# Altium footprint library Hare_Library.PcbLib: 252 footprints (part 6 of 16)
Each footprint in its own frame and in the unit in brackets; x right, y up, seen from the top. Pads: shape width x height; smd on the part's side, far side on the other; paste and mask are expansions set on the pad; w line width, h text height; cw(c..) or ccw(c..) is an arc to the next point about the centre after c.
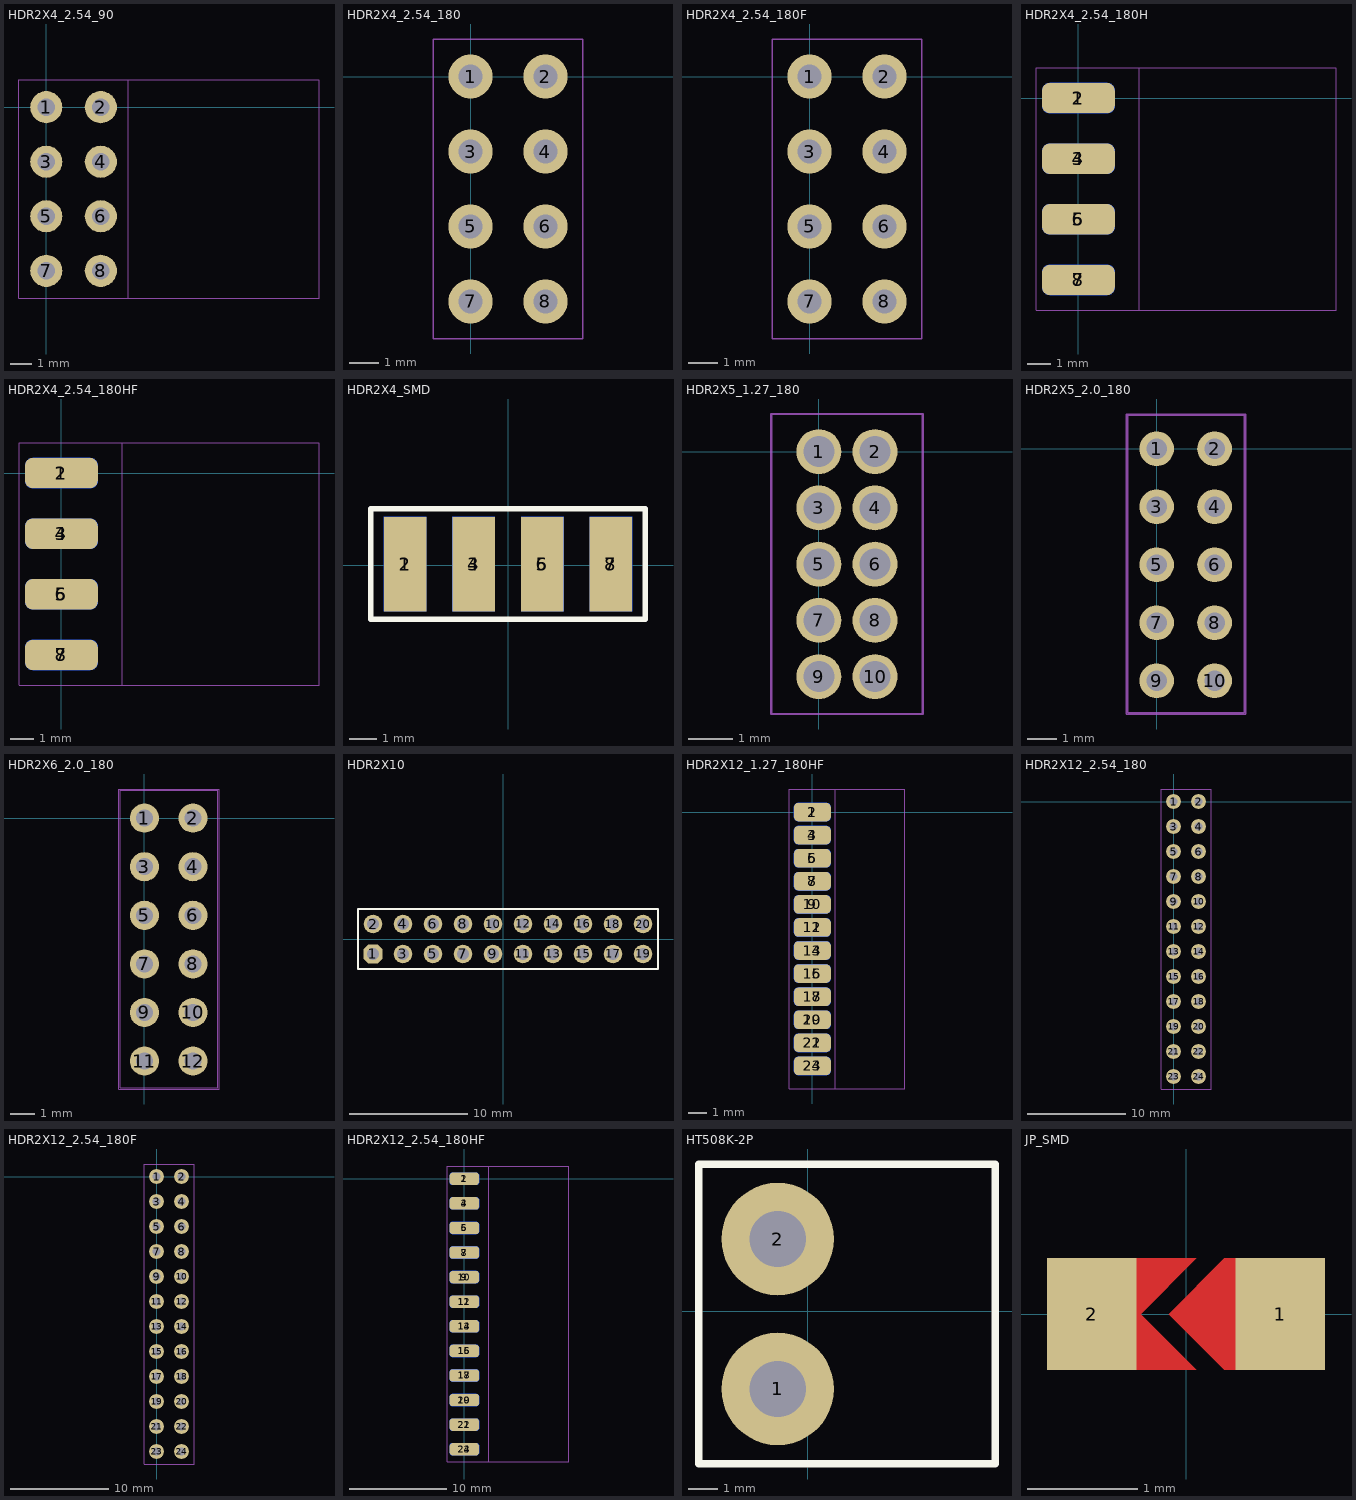
[diagram p5: the footprints below, top view; thin cyan lines are the x and y axes]

## HDR2X4_2.54_90 [mm]
height 4.3
pads (8):
  round 1.5 hole 0.813: 1(0,0) 2(2.54,0) 3(0,-2.54) 4(2.54,-2.54) 5(0,-5.08) 6(2.54,-5.08) 7(0,-7.62) 8(2.54,-7.62)
Mechanical 13:
  lines w0.051: -1.27,-8.89 12.7,-8.89 12.7,1.27 -1.27,1.27 -1.27,-8.89
Mechanical 14:
  lines w0.051: -1.27,-8.89 3.81,-8.89 3.81,1.27 -1.27,1.27 -1.27,-8.89
3D body "pin_header_awl254-da-g08d.stp": height 5.04, standoff -2.96, extent -0.316,-8.89 12.564,1.27

## HDR2X4_2.54_180 [mm]
height 4.3
pads (8):
  round 1.5 hole 0.813: 1(0,0) 2(2.54,0) 3(0,-2.54) 4(2.54,-2.54) 5(0,-5.08) 6(2.54,-5.08) 7(0,-7.62) 8(2.54,-7.62)
Mechanical 13:
  lines w0.051: -1.27,-8.89 -1.27,1.27 3.81,1.27 3.81,-8.89 -1.27,-8.89
Mechanical 14:
  lines w0.051: -1.27,-8.89 -1.27,1.27 3.81,1.27 3.81,-8.89 -1.27,-8.89
3D body "pin_header_awl254-dg-g08d.stp": height 8.5, standoff -3, extent -1.27,-8.89 3.81,1.27

## HDR2X4_2.54_180F [mm]
height 4.3
pads (8):
  round 1.5 hole 0.813: 1(0,0) 2(2.54,0) 3(0,-2.54) 4(2.54,-2.54) 5(0,-5.08) 6(2.54,-5.08) 7(0,-7.62) 8(2.54,-7.62)
Mechanical 13:
  lines w0.051: -1.27,-8.89 -1.27,1.27 3.81,1.27 3.81,-8.89 -1.27,-8.89
Mechanical 14:
  lines w0.051: -1.27,-8.89 -1.27,1.27 3.81,1.27 3.81,-8.89 -1.27,-8.89
3D body "female_header_a-bl254-dg-g08d.stp": height 8.5, standoff -3.2, extent -1.23,-9.015 3.77,1.395

## HDR2X4_2.54_180H [mil]
height 169.29
pads (8):
  rrect50% 120x50 smd: 1(0,0) 3(0,-100) 5(0,-200) 7(0,-300)
  rrect50% 120x50 smd far side: 2(0,0) 4(0,-100) 6(0,-200) 8(0,-300)
Mechanical 13:
  lines w2: -70,-350 425,-350 425,50 -70,50 -70,-350
Mechanical 14:
  lines w2: -70,-350 100,-350 100,50 -70,50 -70,-350
Mechanical 15:
  lines w2: -70,-350 100,-350 100,50 -70,50 -70,-350
3D body "pin_header_awl254-dg-g08d.stp": height 78, standoff -122, extent -38.11,-350 414.64,50

## HDR2X4_2.54_180HF [mil]
height 169.29
pads (8):
  rrect50% 120x50 smd: 1(0,0) 3(0,-100) 5(0,-200) 7(0,-300)
  rrect50% 120x50 smd far side: 2(0,0) 4(0,-100) 6(0,-200) 8(0,-300)
Mechanical 13:
  lines w2: -70,-350 -70,50 425,50 425,-350 -70,-350
Mechanical 14:
  lines w2: -70,-350 -70,50 100,50 100,-350 -70,-350
Mechanical 15:
  lines w2: -70,-350 -70,50 100,50 100,-350 -70,-350
3D body "female_header_a-bl254-dg-g08d.stp": height 76.43, standoff -120.43, extent -35.98,-354.92 424.65,54.92

## HDR2X4_SMD [mm]
pads (8):
  rect 1.575x3.5 smd: 1(-3.819,0.047) 3(-1.279,0.047) 5(1.261,0.047) 7(3.801,0.047)
  rect 1.575x3.5 smd far side: 2(-3.819,0.047) 4(-1.279,0.047) 6(1.261,0.047) 8(3.801,0.047)
Top Overlay:
  lines w0.203: -5.089,-2 5.071,-2 5.071,2.1 -5.089,2.1 -5.089,-2
3D body "User Library-1x2 TH Pitch 2_54mm.SLDPRT": height 1.57, standoff -3.51, extent -5.095,-11.221 -2.555,1.475
3D body "User Library-1x2 TH Pitch 2_54mm.SLDPRT": height 1.57, standoff -3.51, extent -2.55,-11.221 -0.01,1.475
3D body "User Library-1x2 TH Pitch 2_54mm.SLDPRT": height 1.57, standoff -3.51, extent 0.005,-11.221 2.545,1.475
3D body "User Library-1x2 TH Pitch 2_54mm.SLDPRT": height 1.57, standoff -3.51, extent 2.55,-11.221 5.09,1.475

## HDR2X5_1.27_180 [mil]
height 169.29
pads (10):
  round 40 hole 27.56: 1(0,0) 2(50,0) 3(0,-50) 4(50,-50) 5(0,-100) 6(50,-100) 7(0,-150) 8(50,-150) 9(0,-200) 10(50,-200)
Mechanical 13:
  lines w2: -42.32,-233.27 -42.32,33.46 92.52,33.46 92.52,-233.27 -42.32,-233.27
Mechanical 14:
  lines w2: -42.32,-233.27 -42.32,33.46 92.52,33.46 92.52,-233.27 -42.32,-233.27

## HDR2X5_2.0_180 [mm]
height 4.3
pads (10):
  round 1.2 hole 0.7: 1(0,0) 2(2,0) 3(0,-2) 4(2,-2) 5(0,-4) 6(2,-4) 7(0,-6) 8(2,-6) 9(0,-8) 10(2,-8)
Mechanical 13:
  lines w0.051: -1,-9.1 -1,1.15 3.025,1.15 3.025,-9.1 -1,-9.1
Mechanical 14:
  lines w0.051: -1.05,-9.15 -1.05,1.2 3.075,1.2 3.075,-9.15 -1.05,-9.15

## HDR2X6_2.0_180 [mm]
height 4.3
pads (12):
  round 1.2 hole 0.7: 1(0,0) 2(2,0) 3(0,-2) 4(2,-2) 5(0,-4) 6(2,-4) 7(0,-6) 8(2,-6) 9(0,-8) 10(2,-8) 11(0,-10) 12(2,-10)
Mechanical 13:
  lines w0.051: -1,-11.1 3.025,-11.1 3.025,1.15 -1,1.15 -1,-11.1
Mechanical 14:
  lines w0.051: -1.05,-11.15 3.075,-11.15 3.075,1.2 -1.05,1.2 -1.05,-11.15

## HDR2X10 [mil]
pads (20):
  oct 62x62 hole 40: 1(-435,-50)
  round 62 hole 40: 2(-435,50) 3(-335,-50) 4(-335,50) 5(-235,-50) 6(-235,50) 7(-135,-50) 8(-135,50) 9(-35,-50) 10(-35,50) 11(65,-50) 12(65,50) 13(165,-50) 14(165,50) 15(265,-50) 16(265,50) 17(365,-50) 18(365,50) 19(465,-50) 20(465,50)
Top Overlay:
  lines w8: -485,-100 -485,100 -410,100 515,100 515,-100 -410,-100 -485,-100
3D body "User Library-1x2 TH Pitch 2_54mm.SLDPRT": height 373.85, standoff -125.98, extent 416,-99 516,101
3D body "User Library-1x2 TH Pitch 2_54mm.SLDPRT": height 373.85, standoff -125.98, extent 316,-99 416,101
3D body "User Library-1x2 TH Pitch 2_54mm.SLDPRT": height 373.85, standoff -125.98, extent 216,-99 316,101
3D body "User Library-1x2 TH Pitch 2_54mm.SLDPRT": height 373.85, standoff -125.98, extent 116,-99 216,101
3D body "User Library-1x2 TH Pitch 2_54mm.SLDPRT": height 373.85, standoff -125.98, extent 16,-99 116,101
3D body "User Library-1x2 TH Pitch 2_54mm.SLDPRT": height 373.85, standoff -125.98, extent -84,-99 16,101
3D body "User Library-1x2 TH Pitch 2_54mm.SLDPRT": height 373.85, standoff -125.98, extent -184,-99 -84,101
3D body "User Library-1x2 TH Pitch 2_54mm.SLDPRT": height 373.85, standoff -125.98, extent -284,-99 -184,101
3D body "User Library-1x2 TH Pitch 2_54mm.SLDPRT": height 373.85, standoff -125.98, extent -384,-99 -284,101
3D body "User Library-1x2 TH Pitch 2_54mm.SLDPRT": height 373.85, standoff -125.98, extent -484,-99 -384,101

## HDR2X12_1.27_180HF [mil]
height 169.29
pads (24):
  rrect50% 80x40 smd: 1(0,0) 3(0,-50) 5(0,-100) 7(0,-150) 9(0,-200) 11(0,-250) 13(0,-300) 15(0,-350) 17(0,-400) 19(0,-450) 21(0,-500) 23(0,-550)
  rrect50% 80x40 smd far side: 2(0,0) 4(0,-50) 6(0,-100) 8(0,-150) 10(0,-200) 12(0,-250) 14(0,-300) 16(0,-350) 18(0,-400) 20(0,-450) 22(0,-500) 24(0,-550)
Mechanical 13:
  lines w2: -50,-600 -50,50 200,50 200,-600 -50,-600
Mechanical 14:
  lines w2: -50,-600 -50,50 50,50 50,-600 -50,-600
3D body "female_header_a-bl127-dg-g24d.stp": height 39.02, standoff -83.02, extent -28.34,-582.88 200,32.87

## HDR2X12_2.54_180 [mm]
height 4.3
pads (24):
  round 1.5 hole 0.813: 1(0,0) 2(2.54,0) 3(0,-2.54) 4(2.54,-2.54) 5(0,-5.08) 6(2.54,-5.08) 7(0,-7.62) 8(2.54,-7.62) 9(0,-10.16) 10(2.54,-10.16) 11(0,-12.7) 12(2.54,-12.7) 13(0,-15.24) 14(2.54,-15.24) 15(0,-17.78) 16(2.54,-17.78) 17(0,-20.32) 18(2.54,-20.32) 19(0,-22.86) 20(2.54,-22.86) 21(0,-25.4) 22(2.54,-25.4) 23(0,-27.94) 24(2.54,-27.94)
Mechanical 13:
  lines w0.051: -1.27,-29.21 3.81,-29.21 3.81,1.27 -1.27,1.27 -1.27,-29.21
Mechanical 14:
  lines w0.051: -1.27,-29.21 -1.27,1.27 3.81,1.27 3.81,-29.21 -1.27,-29.21
3D body "pin_header_awl254-dg-g24d.stp": height 8.5, standoff -3, extent -1.27,-29.21 3.81,1.27

## HDR2X12_2.54_180F [mm]
height 4.3
pads (24):
  round 1.5 hole 0.813: 1(0,0) 2(2.54,0) 3(0,-2.54) 4(2.54,-2.54) 5(0,-5.08) 6(2.54,-5.08) 7(0,-7.62) 8(2.54,-7.62) 9(0,-10.16) 10(2.54,-10.16) 11(0,-12.7) 12(2.54,-12.7) 13(0,-15.24) 14(2.54,-15.24) 15(0,-17.78) 16(2.54,-17.78) 17(0,-20.32) 18(2.54,-20.32) 19(0,-22.86) 20(2.54,-22.86) 21(0,-25.4) 22(2.54,-25.4) 23(0,-27.94) 24(2.54,-27.94)
Mechanical 13:
  lines w0.051: -1.27,-29.21 3.81,-29.21 3.81,1.27 -1.27,1.27 -1.27,-29.21
Mechanical 14:
  lines w0.051: -1.27,-29.21 -1.27,1.27 3.81,1.27 3.81,-29.21 -1.27,-29.21
3D body "female_header_a-bl254-dg-g24d.stp": height 8.5, standoff -3.2, extent -1.23,-29.335 3.77,1.395

## HDR2X12_2.54_180HF [mil]
height 169.29
pads (24):
  rrect50% 120x50 smd: 1(0,0) 3(0,-100) 5(0,-200) 7(0,-300) 9(0,-400) 11(0,-500) 13(0,-600) 15(0,-700) 17(0,-800) 19(0,-900) 21(0,-1000) 23(0,-1100)
  rrect50% 120x50 smd far side: 2(0,0) 4(0,-100) 6(0,-200) 8(0,-300) 10(0,-400) 12(0,-500) 14(0,-600) 16(0,-700) 18(0,-800) 20(0,-900) 22(0,-1000) 24(0,-1100)
Mechanical 13:
  lines w2: -70,-1150 425,-1150 425,50 -70,50 -70,-1150
Mechanical 14:
  lines w2: -70,-1150 100,-1150 100,50 -70,50 -70,-1150
Mechanical 15:
  lines w2: -70,-1150 -70,50 100,50 100,-1150 -70,-1150
3D body "female_header_a-bl254-dg-g24d.stp": height 76.43, standoff -120.43, extent -35.97,-1154.92 424.66,54.92

## HT508K-2P [mil]
pads (2):
  round 150 hole 75: 1(-40,-104) 2(-40,96)
Top Overlay:
  lines w10: -145,-204 -145,196 250,196 250,-204 -145,-204

## JP_SMD [mil]
height 78.74
pads (2):
  rect 32x40 smd: 1(33.75,0) 2(-33.75,0)
Top Layer:
  region: -26.25,0 -16.25,0 3.75,-20 -26.25,-20
  region: -26.25,0 -16.25,0 3.75,20 -26.25,20
  region: 23.75,20 13.75,20 -6.25,0 13.75,-20 23.75,-20
Top Paste:
  region: -26.25,0 -16.25,0 3.75,-20 -26.25,-20
  region: -26.25,0 -16.25,0 3.75,20 -26.25,20
  region: 23.75,20 13.75,20 -6.25,0 13.75,-20 23.75,-20
Top Solder:
  region: -26.25,0 -12.25,0 11.75,-24 -26.25,-24
  region: -26.25,0 -12.25,0 11.75,24 -26.25,24
  region: 23.75,24 13.75,24 -10.25,0 13.75,-24 23.75,-24